# Altium footprint library Misc.PcbLib: 159 footprints (part 1 of 10)
Each footprint in its own frame and in the unit in brackets; x right, y up, seen from the top. Pads: shape width x height; smd on the part's side, far side on the other; paste and mask are expansions set on the pad; w line width, h text height; cw(c..) or ccw(c..) is an arc to the next point about the centre after c.
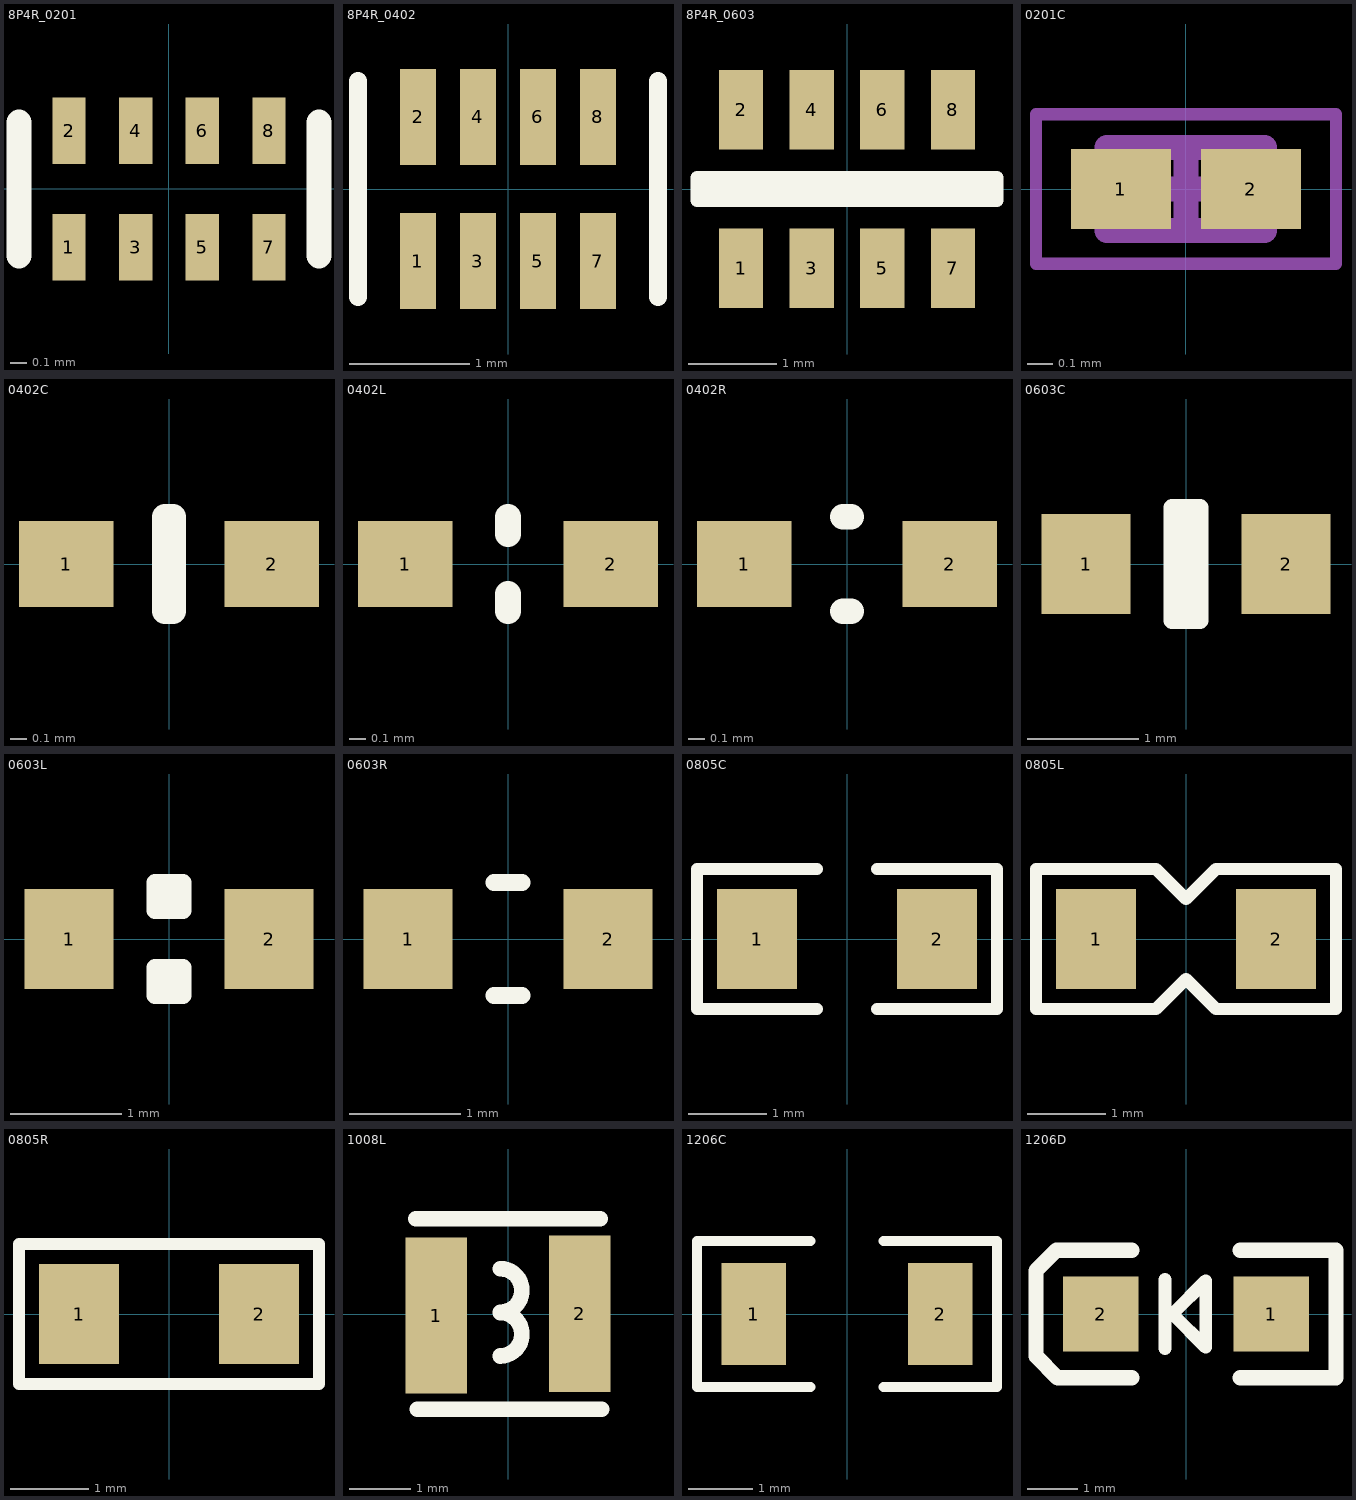
[diagram p0: the footprints below, top view; thin cyan lines are the x and y axes]

## 8P4R_0201 [mm]
pads (8):
  rect 0.2x0.4 smd: 1(-0.6,-0.35) 2(-0.6,0.35) 3(-0.2,-0.35) 4(-0.2,0.35) 5(0.2,-0.35) 6(0.2,0.35) 7(0.6,-0.35) 8(0.6,0.35)
Top Overlay:
  lines w0.152: -0.9,-0.4 -0.9,0.4 ; 0.9,-0.4 0.9,0.4
3D body: height 0.35, standoff 0, extent -0.7,-0.3 0.7,0.3

## 8P4R_0402 [mm]
pads (8):
  rect 0.3x0.8 smd: 1(-0.75,-0.6) 2(-0.75,0.6) 3(-0.25,-0.6) 4(-0.25,0.6) 5(0.25,-0.6) 6(0.25,0.6) 7(0.75,-0.6) 8(0.75,0.6)
Top Overlay:
  lines w0.152: -1.25,-0.9 -1.25,0.9 ; 1.25,-0.9 1.25,0.9
3D body: height 0.5, standoff 0, extent -1,-0.5 1,0.5

## 8P4R_0603 [mm]
pads (8):
  rect 0.5x0.9 smd: 1(-1.2,-0.9) 2(-1.2,0.9) 3(-0.4,-0.9) 4(-0.4,0.9) 5(0.4,-0.9) 6(0.4,0.9) 7(1.2,-0.9) 8(1.2,0.9)
Top Overlay:
  region: 1.7,-0.127 1.7,0.127 -1.7,0.127 -1.7,-0.127
  lines w0.152: -1.7,-0.127 1.7,-0.127 1.7,0.127 -1.7,0.127 -1.7,-0.127
3D body: height 0.5, standoff 0, extent -1.6,-0.8 1.6,0.8

## 0201C [mm] "Chip Capacitor, 2-Leads, Body 0.60x0.30mm, IPC High Density"
height 0.33
pads (2):
  rect 0.4x0.32 smd: 1(-0.26,0) 2(0.26,0)
Mechanical 13:
  lines w0.1: -0.315,-0.165 0.315,-0.165 0.315,0.165 -0.315,0.165 -0.315,-0.165
Mechanical 15:
  lines w0.05: -0.6,-0.3 0.6,-0.3 0.6,0.3 -0.6,0.3 -0.6,-0.3
  lines w0.1: -0.165,0 0.165,0 ; 0,-0.165 0,0.165
3D body "0201C.step": height 0.33, standoff 0, extent -0.315,-0.165 0.315,0.165

## 0402C [mil]
pads (2):
  rect 22x20 smd: 1(-24,0) 2(24,0)
Top Overlay:
  lines w6: -1,-11 -1,11 1,11 1,-11 -1,-11
3D body "0402 SMD Capacitor.step": height 7.95, standoff 0, extent -19.68,-11.81 19.69,11.81

## 0402L [mil]
pads (2):
  rect 22x20 smd: 1(-24,0) 2(24,0)
Top Overlay:
  lines w6: 0,-11 0,-7 ; 0,7 0,11
3D body: height 10, standoff 0, extent 17,-10 20,10
3D body: height 10, standoff 0, extent -19,-10 -16,10
3D body: height 10, standoff 0, extent -16,-10 17,10

## 0402R [mil]
pads (2):
  rect 22x20 smd: 1(-24,0) 2(24,0)
Top Overlay:
  lines w6: -1,-11 1,-11 ; -1,11 1,11
3D body "User Library-RES_1005-0402.STEP": height 16.14, standoff 0, extent -22.63,-10.82 22.64,10.83

## 0603C [mm]
pads (2):
  rect 0.8x0.9 smd: 1(-0.9,0) 2(0.9,0)
Top Overlay:
  lines w0.152: 0,-0.508 0,0.508 ; -0.127,-0.508 0.127,-0.508 0.127,0.508 -0.127,0.508 -0.127,-0.508
3D body "User Library-0603 SMD Capacitor.STEP": height 0.3, standoff 0, extent -0.8,-0.4 0.8,0.4

## 0603L [mm]
pads (2):
  rect 0.8x0.9 smd: 1(-0.9,0) 2(0.9,0)
Top Overlay:
  lines w0.152: 0,-0.508 0,-0.254 ; 0,0.254 0,0.508 ; -0.127,-0.508 0.127,-0.508 0.127,-0.254 -0.127,-0.254 -0.127,-0.508 ; -0.127,0.254 -0.127,0.508 0.127,0.508 0.127,0.254 -0.127,0.254
3D body: height 0.51, standoff 0, extent -0.609,-0.381 -0.406,0.381
3D body: height 0.51, standoff 0, extent 0.711,-0.381 0.915,0.381
3D body: height 0.51, standoff 0, extent -0.559,-0.381 0.559,0.381

## 0603R [mm]
pads (2):
  rect 0.8x0.9 smd: 1(-0.9,0) 2(0.9,0)
Top Overlay:
  lines w0.152: -0.127,-0.508 0.127,-0.508 ; -0.127,0.508 0.127,0.508
3D body "User Library-RES_1609-0603.STEP": height 0.56, standoff 0, extent -0.85,-0.4 0.85,0.4

## 0805C [mil]
pads (2):
  rect 40x50 smd: 1(-45,0) 2(45,0)
Top Overlay:
  lines w6: -15,-35 -75,-35 -75,35 -15,35 ; 15,-35 75,-35 75,35 15,35
3D body "Capacitor 0805 SMD.step": height 36.61, standoff -0.39, extent -55.04,-28.3 63.07,26.81

## 0805L [mil] "1/8W"
pads (2):
  rect 40x50 smd: 1(-45,0) 2(45,0)
Top Overlay:
  lines w6: -75,-35 -75,35 -15,35 0,20 15,35 75,35 75,-35 15,-35 0,-20 -15,-35 -75,-35
3D body "R0805.STEP": height 21.65, standoff 0, extent -39.36,-24.8 39.37,24.81

## 0805R [mil] "small type  ver20150428"
pads (2):
  rect 40x50 smd: 1(-45,0) 2(45,0)
Top Overlay:
  lines w6: -75,-35 75,-35 75,35 -75,35 -75,-35
3D body "User Library-RES_2013-0805.STEP": height 29.92, standoff 0, extent -45.27,-26.57 45.28,26.58

## 1008L [mil] "2520"
height 209.84
pads (2):
  rect 39.37x100 smd: 1(-46,-1) 2(46,0.13)
Top Overlay:
  lines w10: -59.06,61 59.06,61 ; -58.11,-61 60,-61 ; -5,-26.86 ccw(c-5,-12.93) -5,1 ; -5,1.14 ccw(c-5,15.07) -5,29
3D body "AISC-1008F.STEP": height 91.14, standoff 0.09, extent -57.48,-54.92 57.48,54.93

## 1206C [mil]
pads (2):
  rect 40x63 smd: 1(-57.5,0) 2(57.5,0)
Top Overlay:
  lines w6: -22.5,-45 -92.5,-45 -92.5,45 -22.5,45 ; 22.5,-45 92.5,-45 92.5,45 22.5,45
3D body "User Library-cap_1206_0_95.step": height 37.4, standoff 0, extent -60.49,-31.49 65.5,31.5

## 1206D [mm] "1/4W"
pads (2):
  rect 1.5x1.5 smd: 1(1.7,0) 2(-1.7,0)
Top Overlay:
  lines w0.254: -0.419,-0.686 -0.419,0.686 ; -0.267,0 0.394,0.66 0.394,0.381 0.394,-0.66 -0.267,0
  lines w0.305: -1.079,-1.27 -2.553,-1.27 -2.984,-0.838 -2.984,0.864 -2.578,1.27 -1.079,1.27 ; 1.079,-1.27 2.984,-1.27 2.984,1.27 1.079,1.27
3D body "SOD-80.STEP": height 1.5, standoff 0, extent -1.737,-0.75 1.763,0.75